# Altium schematic symbol library SCHLIB.SchLib: 2608 symbols (part 7 of 20) (continued)
## IC-SN65176BDR (continued)
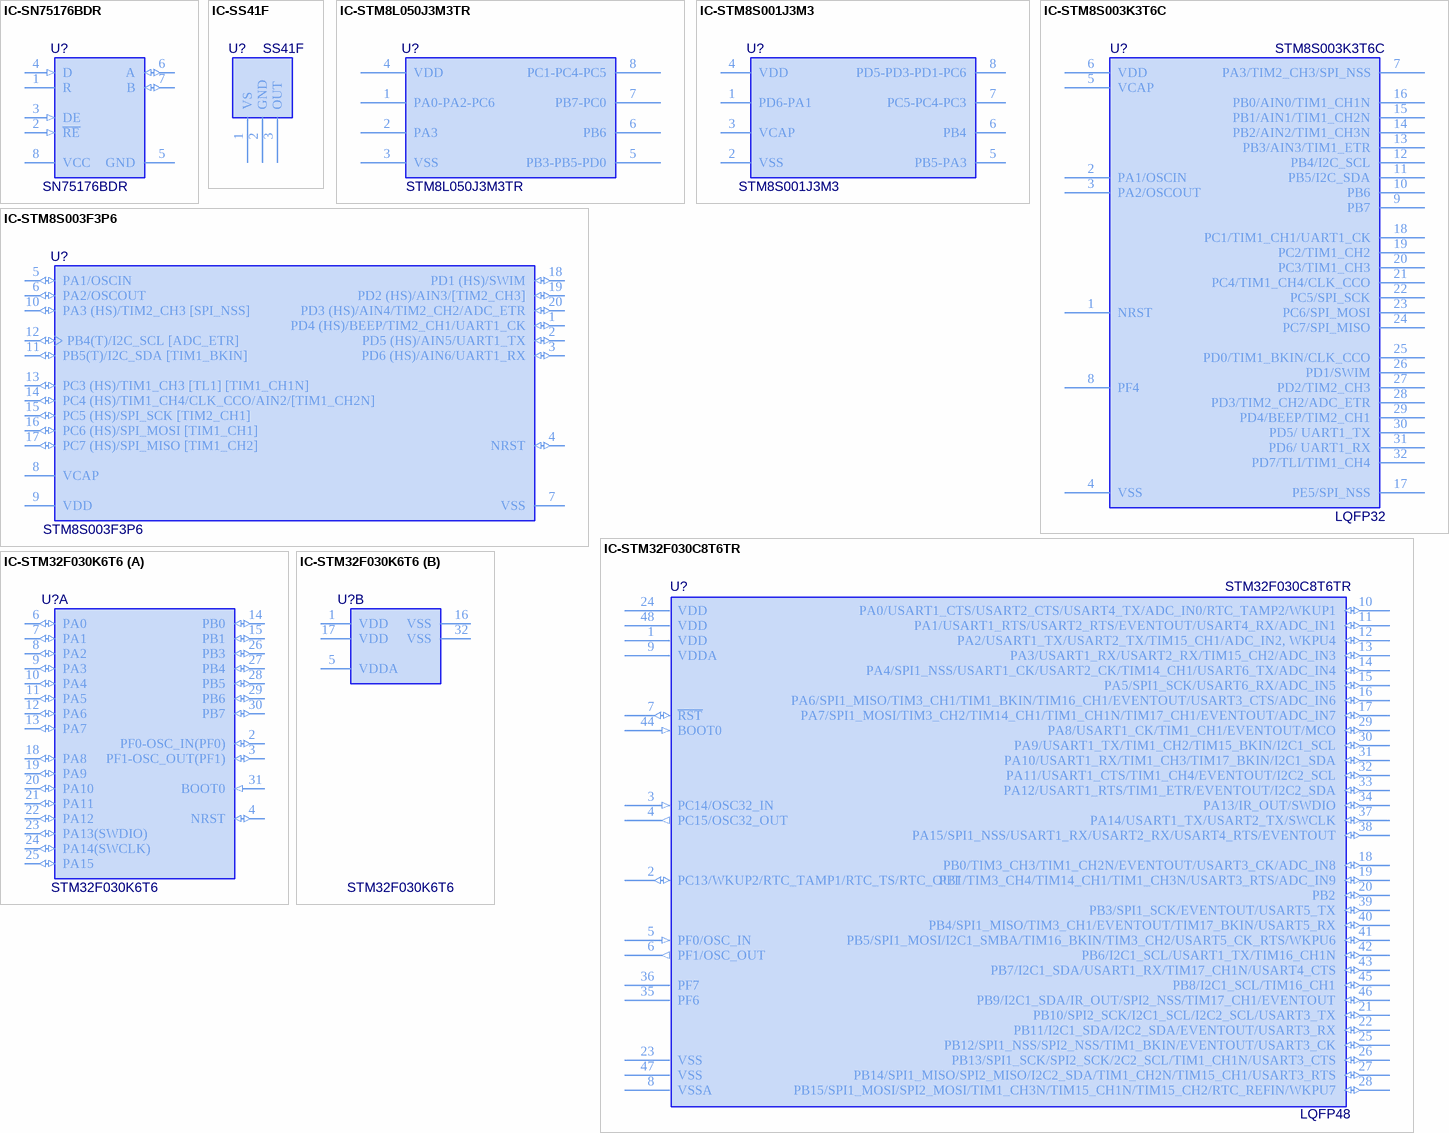
[diagram p27: symbols IC-SN75176BDR to IC-STM32F030K6T6]

## IC-SN75176BDR
designator U?, comment SN75176BDR
IC TXRX DIFF BUSS 8SOIC; Manufacturer: Texas Instruments; Data Rate: 10Mbps; Number of Receivers: 1; Operating Supply Voltage: 5V; Min Supply Voltage: 4.75V; Max Supply Voltage: 5.25V; Nominal Supply Current: 70mA; Logic Function: Transceiver; Simplex/Duplex: Half Duplex; Output Current: 60mA; Washability: OK; ComponentLink1URL: http://www.ti.com/general/docs/lit/getliterature.tsp?genericPartNumber=SN75176B&fileType=pdf; ComponentLink2URL: http://www.ti.com/lit/ml/msoi002j/msoi002j.pdf; ComponentLink2Description: Package Specification; ComponentLink1Description: Datasheet; Supplier 1: Digi-Key; Manufacturer Part Number: SN75176BDR; Stock 1: 10154; Pricing 1: 1=1.52000, 10=1.36800, 100=1.09940, 500=0.90324, 1000=0.74840 (USD); RoHS: Yes; Case/Package: D; Number of Pins: 8; Weight: 0.002561oz; Min Operating Temperature: 0°C; Max Operating Temperature: 70°C; Number of Transmitters: 1; Packaging: Tape and Reel; Package Quantity: 1; Number of Drivers: 1; Number of Transceivers: 1; Operating Supply Current: 70mA; Length: 4.9mm; Height: 1.58mm; Width: 3.91mm; Lead Free: Lead Free; REACH SVHC: No SVHC; ComponentLink3URL: https://datasheet.ciiva.com/4788/sn75176b-201537-4788388.pdf?src-supplier=Mouser; ComponentLink3Description: https://datasheet.ciiva.com/4788/sn75176b-201537-4788388.pdf?src-supplier=Mouser; ComponentLink4URL: https://datasheet.ciiva.com/34301/1054060-34301926.pdf?src-supplier=Jameco; ComponentLink4Description: https://datasheet.ciiva.com/34301/1054060-34301926.pdf?src-supplier=Jameco; ComponentLink5URL: https://datasheet.ciiva.com/1700/sn65176b-1700772.pdf?src-supplier=Digi-Key; ComponentLink5Description: https://datasheet.ciiva.com/1700/sn65176b-1700772.pdf?src-supplier=Digi-Key; ComponentLink6URL: https://datasheet.ciiva.com/1700/sn65176b-1700773.pdf?src-supplier=Digi-Key; ComponentLink6Description: https://datasheet.ciiva.com/1700/sn65176b-1700773.pdf?src-supplier=Digi-Key; ComponentLink7URL: https://datasheet.ciiva.com/1700/sn65176b-1700774.pdf?src-supplier=Digi-Key; ComponentLink7Description: https://datasheet.ciiva.com/1700/sn65176b-1700774.pdf?src-supplier=Digi-Key; ComponentLink8URL: https://datasheet.ciiva.com/46394/1886104-46394518.pdf?src-supplier=Element14; ComponentLink8Description: https://datasheet.ciiva.com/46394/1886104-46394518.pdf?src-supplier=Element14; ComponentLink9URL: https://datasheet.ciiva.com/8064/1886104-8064823.pdf?src-supplier=Element14; ComponentLink9Description: https://datasheet.ciiva.com/8064/1886104-8064823.pdf?src-supplier=Element14; ComponentLink10URL: https://datasheet.ciiva.com/46394/1886104-46394519.pdf?src-supplier=Element14; ComponentLink10Description: https://datasheet.ciiva.com/46394/1886104-46394519.pdf?src-supplier=Element14; ComponentLink11URL: https://datasheet.ciiva.com/46398/1886104-46398058.pdf?src-supplier=Element14; ComponentLink11Description: https://datasheet.ciiva.com/46398/1886104-46398058.pdf?src-supplier=Element14; ComponentLink12URL: https://datasheet.ciiva.com/48709/001048058-da-01-en-ic-dff-bus-txcvr-s-sn75176bdr-soic-8-tid-48709082.pdf?src-supplier=Conrad; ComponentLink12Description: https://datasheet.ciiva.com/48709/001048058-da-01-en-ic-dff-bus-txcvr-s-sn75176bdr-soic-8-tid-48709082.pdf?src-supplier=Conrad; Supplier Part Number 1: 296-1275-1-ND
footprint SOIC8-D0008A_M (SOIC, 8-Leads, Body 5x4mm, Pitch 1.27mm, IPC Low Density)
pins: 1 R (hiz), 2 ~{RE} (in), 3 DE (in), 4 D (in), 5 GND (power), 6 A (io), 7 B (io), 8 VCC (power)

## IC-SS41F
designator U?, comment SS41F
MAGNETIC SWITCH BIPOLAR RADIAL; Manufacturer: Honeywell; Nominal Supply Current: 10mA; Max Output Current: 20mA; Max Supply Voltage: 24V; Min Supply Voltage: 4.5V; Output Voltage: 400mV; Leakage Current: 10uA; Output Type: Digital; Max Surge Current: 1.5A; Forward Voltage: 600mV; Recovery Time: 10ns; Average Rectified Current: 350mA; Max Reverse Leakage Current: 5uA; Max Repetitive Reverse Voltage (Vrrm): 40V; Power Dissipation: 400mW; Element Configuration: Single; Polarity: Standard; Capacitance: 50pF; Washability: OK; Supplier 1: Digi-Key; Supplier Part Number 1: 480-5925-ND; Manufacturer Part Number: SS41F; Stock 1: 5477; Pricing 1: 1=1.96, 5=1.856, 10=1.59, 25=1.272, 50=1.166, 100=1.06, 500=0.9275, 1000=0.8215, 5000=0.7685 (USD); Case/Package: SIP; Number of Pins: 3; Min Operating Temperature: -40°C; Max Operating Temperature: 150°C; Packaging: Bulk; Package Quantity: 1000; Operating Supply Current: 10mA; Output Current: 20mA; Type: Integrated Circuit (IC); Mount: Surface Mount; Reverse Recovery Time: 10ns; Peak Non-Repetitive Surge Current: 1.5A; Peak Reverse Current: 5uA; Forward Current: 350mA; Max Forward Surge Current (Ifsm): 1.5A; Voltage Rating (DC): 40V; Current Rating: 350mA; Max Reverse Voltage (DC): 40V; Radiation Hardening: No; REACH SVHC: Unknown; Lead Free: Lead Free; ComponentLink1URL: https://www.verical.com/server-webapp/html/getDatasheet?partID=331926&src-supplier=Verical; ComponentLink1Description: https://www.verical.com/server-webapp/html/getDatasheet?partID=331926&src-supplier=Verical; ComponentLink2URL: http://www.mccsemi.com/up_pdf/SD103AWS-SD103CWS(SOD-323).PDF?src-supplier=Future+Electronics; ComponentLink2Description: http://www.mccsemi.com/up_pdf/SD103AWS-SD103CWS(SOD-323).PDF?src-supplier=Future+Electronics; ComponentLink3URL: http://www.mccsemi.com/up_pdf/SD103AWS-SD103CWS(SOD-323).PDF?src-supplier=Digi-Key; ComponentLink3Description: http://www.mccsemi.com/up_pdf/SD103AWS-SD103CWS(SOD-323).PDF?src-supplier=Digi-Key; ComponentLink4URL: http://www.farnell.com/datasheets/1684867.pdf?src-supplier=Element14; ComponentLink4Description: http://www.farnell.com/datasheets/1684867.pdf?src-supplier=Element14
footprint 3-sip
pins: 1 VS, 2 GND, 3 OUT

## IC-STM8L050J3M3TR
designator U?, comment STM8L050J3M3TR
8-BIT MICROCONTROLLERS - MCU; Manufacturer: STMicroelectronics; Washability: OK; Manufacturer Part Number: STM8L050J3M3TR; Stock: 2754; Pricing: 1=0.81, 10=0.713, 25=0.6696, 100=0.5465, 250=0.5076, 500=0.432, 1000=0.3456 (USD); RoHS: No; Supplier 1: Digi-Key; Supplier Part Number 1: 497-19455-1-ND; ComponentLink1Description: Datasheet; ComponentLink1URL: https://www.st.com/resource/en/datasheet/stm8l050j3.pdf
footprint SOIC8
pins: 1 PA0-PA2-PC6, 2 PA3, 3 VSS, 4 VDD, 5 PB3-PB5-PD0, 6 PB6, 7 PB7-PC0, 8 PC1-PC4-PC5

## IC-STM8S001J3M3
designator U?, comment STM8S001J3M3
8BIT MCU 8KBYTES FLASH 16MHZ CPU; Manufacturer: STMicroelectronics; Interface: I2C,SPI,IrDA,UART,USART; Peripherals: Brown-out Detect/Reset,POR,PWM,WDT; Number of I/Os: 5; Memory Size: 8KB; Oscillator Type: Internal; Washability: OK; Supplier 1: Digi-Key; Supplier Part Number 1: 497-17612-ND; Manufacturer Part Number: STM8S001J3M3; Stock 1: 5768; Pricing 1: 1=0.63, 10=0.554, 25=0.5208, 100=0.425, 250=0.3948, 500=0.336, 1000=0.2688, 2500=0.2436, 5000=0.2268 (USD); Case/Package: SOIC; Min Operating Temperature: -40°C; Max Operating Temperature: 125°C; Memory Type: FLASH; Packaging: Rail/Tube; Frequency: 16MHz; ComponentLink1URL: http://www.st.com/content/ccc/resource/technical/document/datasheet/group3/18/df/6e/12/9c/ca/41/75/DM00390996/files/DM00390996.pdf/jcr:content/translations/en.DM00390996.pdf?src-supplier=Digi-Key; ComponentLink1Description: http://www.st.com/content/ccc/resource/technical/document/datasheet/group3/18/df/6e/12/9c/ca/41/75/DM00390996/files/DM00390996.pdf/jcr:content/translations/en.DM00390996.pdf?src-supplier=Digi-Key; ComponentLink2URL: http://www.farnell.com/datasheets/2342758.pdf?src-supplier=Newark; ComponentLink2Description: http://www.farnell.com/datasheets/2342758.pdf?src-supplier=Newark; ComponentLink3URL: http://www.farnell.com/datasheets/2342758.pdf?src-supplier=Farnell; ComponentLink3Description: http://www.farnell.com/datasheets/2342758.pdf?src-supplier=Farnell
footprint SOIC8-D0008A_M (SOIC, 8-Leads, Body 5x4mm, Pitch 1.27mm, IPC Low Density)
pins: 1 PD6-PA1, 2 VSS, 3 VCAP, 4 VDD, 5 PB5-PA3, 6 PB4, 7 PC5-PC4-PC3, 8 PD5-PD3-PD1-PC6

## IC-STM8S003F3P6
designator U?, comment STM8S003F3P6
IC MCU 8BIT 8KB FLASH 20TSSOP; Manufacturer: STMicroelectronics; Connectivity: I²C,IrDA,LIN,SPI,UART/USART; Featured Product: FlasherSeriesofProductionTools; Program Memory Size: 8KB(8Kx8); Oscillator Type: Internal; Other Names: 497-11946-5; Core Processor: STM8; Package Version: Rev. 2, 01/2015; Peripherals: Brown-outDetect/Reset,POR,PWM,WDT; Data Converters: A/D5x10b; Other Related Documents: STM8S003F3ViewAllSpecifications; Number of I/Os: 16; EEPROM Size: 128x8; Speed: 16MHz; Core Size: 8-Bit; RAM Size: 1Kx8; Dynamic Catalog: STM8S; Voltage - Supply (Vcc/Vdd): 2.95V~5.5V; Watchdog Timer: Yes; Min Supply Voltage: 2.95V; Max Supply Voltage: 5.5V; Interface: I2C,SPI,IrDA,UART,USART,LIN; Number of Timers/Counters: 7; Max Power Dissipation: 238mW; Data Bus Width: 8b; Number of ADC Channels: 5; Number of SPI Channels: 1; Washability: OK; Series: STM8S; Category: IntegratedCircuits(ICs); Program Memory Type: FLASH; Packaging: Tube; Datasheet Version: Rev. 8, 04/2016; Manufacturer URL: http://www.st.com/; Package URL: http://www.st.com/st-web-ui/static/active/en/resource/technical/document/datasheet/DM00141386.pdf; Operating Temperature: -40°C~85°C; Package / Case: 20-TSSOP(0.173",4.40mmWidth); Standard Package: 74; Family: Embedded-Microcontrollers; Datasheet URL: http://www2.st.com/content/ccc/resource/technical/document/datasheet/42/5a/27/87/ac/5a/44/88/DM00024550.pdf/files/DM00024550.pdf/jcr:content/translations/en.DM00024550.pdf; Package Description: 20-Pin Thin Shrink Small Outline Package, Body 6.5 x 4.4 mm, Pitch 0.65 mm; Package Reference: TSSOP20; Mounting Technology: SurfaceMount; Number of I /O: 16; Supplier 1: Digi-Key; Supplier Part Number 1: 497-11946-5-ND; Manufacturer Part Number: STM8S003F3P6; Stock: 28510; Pricing: 1=0.77, 10=0.673, 25=0.6324, 100=0.5161, 250=0.4794, 500=0.408, 1000=0.3264, 2500=0.2958, 5000=0.2754 (USD); RoHS: Yes; Mount: Surface Mount; Case/Package: TSSOP; Number of Pins: 20; Min Operating Temperature: -40°C; Max Operating Temperature: 85°C; Frequency: 16MHz; Package Quantity: 74; Max Frequency: 16MHz; Number of I2C Channels: 1; Memory Type: FLASH; Memory Size: 8KB; Number of Programmable I/O: 16; Number of UART Channels: 1; Length: 6.6mm; Height: 1.05mm; Width: 4.5mm; Radiation Hardening: No; REACH SVHC: No SVHC; Lead Free: Lead Free; ComponentLink1URL: https://datasheet.ciiva.com/16216/dm00024550-16216214.pdf?src-supplier=Future+Electronics; ComponentLink1Description: https://datasheet.ciiva.com/16216/dm00024550-16216214.pdf?src-supplier=Future+Electronics; ComponentLink2URL: https://datasheet.ciiva.com/13036/dm00024550-13036971.pdf?src-supplier=Mouser; ComponentLink2Description: https://datasheet.ciiva.com/13036/dm00024550-13036971.pdf?src-supplier=Mouser; ComponentLink3URL: https://datasheet.ciiva.com/17232/dm00024550-17232894.pdf?src-supplier=Avnet+Europe; ComponentLink3Description: https://datasheet.ciiva.com/17232/dm00024550-17232894.pdf?src-supplier=Avnet+Europe
footprint STM-TSSOP20_V (SOP, 20-Leads, Body 6.6x4.5mm, Pitch 0.65mm)
pins: 1 PD4 (HS)/BEEP/TIM2_CH1/UART1_CK (io), 2 PD5 (HS)/AIN5/UART1_TX (io), 3 PD6 (HS)/AIN6/UART1_RX (io), 4 NRST (io) "Reset", 5 PA1/OSCIN (io), 6 PA2/OSCOUT (io), 7 VSS (power) "Digital ground", 8 VCAP (power) "1.8 V regulator  capacitor", 9 VDD (power) "Digital power supply", 10 PA3 (HS)/TIM2_CH3 [SPI_NSS] (io), 11 PB5(T)/I2C_SDA [TIM1_BKIN] (io), 12 PB4(T)/I2C_SCL [ADC_ETR] (io), 13 PC3 (HS)/TIM1_CH3 [TL1] [TIM1_CH1N] (io), 14 PC4 (HS)/TIM1_CH4/CLK_CCO/AIN2/[TIM1_CH2N] (io), 15 PC5 (HS)/SPI_SCK [TIM2_CH1] (io), 16 PC6 (HS)/SPI_MOSI [TIM1_CH1] (io), 17 PC7 (HS)/SPI_MISO [TIM1_CH2] (io), 18 PD1 (HS)/SWIM (io), 19 PD2 (HS)/AIN3/[TIM2_CH3] (io), 20 PD3 (HS)/AIN4/TIM2_CH2/ADC_ETR (io)

## IC-STM8S003K3T6C
designator U?, comment STM8S003K3T6C  Case/Package: LQFP32
IC MCU 8BIT 8KB FLASH 32LQFP; Manufacturer: STMicroelectronics; Interface: I2C,SPI,IrDA,UART,USART,LIN; RAM Size: 1KB; Max Power Dissipation: 330mW; Number of Timers/Counters: 7; Watchdog Timer: Yes; Data Bus Width: 8b; Number of Programmable I/O: 28; Max Frequency: 16MHz; Max Supply Voltage: 5.5V; Min Supply Voltage: 2.95V; Peripherals: Brown-out Detect/Reset,POR,PWM,WDT,I2C; Oscillator Type: Internal; Number of UART Channels: 1; Number of ADC Channels: 5; Data Rate: 8Mbps; Washability: OK; Supplier 1: Mouser; Manufacturer Part Number: STM8S003K3T6C; Stock 1: 1191; Pricing 1: 1=1,21000, 10=1,03000, 100=0,79700, 500=0,70400, 1000=0,55600, 2500=0,49300, 10000=0,47500, 25000=0,46000, 50000=0,44500 (USD); RoHS: Yes; Mount: Surface Mount; Number of Pins: 32; Min Operating Temperature: -40°C; Max Operating Temperature: 85°C; Memory Type: FLASH; Memory Size: 8KB; Packaging: Tray; Frequency: 16MHz; Number of I/Os: 28; Package Quantity: 250; Number of SPI Channels: 1; Number of I2C Channels: 1; Length: 7.2mm; Height: 1.45mm; Width: 7.2mm; Radiation Hardening: No; Lead Free: Lead Free; REACH SVHC: No SVHC; ComponentLink1URL: https://datasheet.ciiva.com/17377/dm00024550-17377834.pdf?src-supplier=Avnet+Europe; ComponentLink1Description: https://datasheet.ciiva.com/17377/dm00024550-17377834.pdf?src-supplier=Avnet+Europe; ComponentLink2URL: https://datasheet.ciiva.com/16380/dm00024550-16380393.pdf?src-supplier=Future+Electronics; ComponentLink2Description: https://datasheet.ciiva.com/16380/dm00024550-16380393.pdf?src-supplier=Future+Electronics; ComponentLink3URL: https://datasheet.ciiva.com/13041/dm00024550-13041260.pdf?src-supplier=Mouser; ComponentLink3Description: https://datasheet.ciiva.com/13041/dm00024550-13041260.pdf?src-supplier=Mouser; Supplier Part Number 1: 511-STM8S003K3T6C
footprint LQFP32
pins: 1 NRST, 2 PA1/OSCIN, 3 PA2/OSCOUT, 4 VSS, 5 VCAP, 6 VDD, 7 PA3/TIM2_CH3/SPI_NSS, 8 PF4, 9 PB7, 10 PB6, 11 PB5/I2C_SDA, 12 PB4/I2C_SCL, 13 PB3/AIN3/TIM1_ETR, 14 PB2/AIN2/TIM1_CH3N, 15 PB1/AIN1/TIM1_CH2N, 16 PB0/AIN0/TIM1_CH1N, 17 PE5/SPI_NSS, 18 PC1/TIM1_CH1/UART1_CK, 19 PC2/TIM1_CH2, 20 PC3/TIM1_CH3, 21 PC4/TIM1_CH4/CLK_CCO, 22 PC5/SPI_SCK, 23 PC6/SPI_MOSI, 24 PC7/SPI_MISO, 25 PD0/TIM1_BKIN/CLK_CCO, 26 PD1/SWIM, 27 PD2/TIM2_CH3, 28 PD3/TIM2_CH2/ADC_ETR, 29 PD4/BEEP/TIM2_CH1, 30  PD5/ UART1_TX, 31 PD6/ UART1_RX, 32 PD7/TLI/TIM1_CH4

## IC-STM32F030C8T6TR
designator U?, comment STM32F030C8T6TR  Package: LQFP48
IC MCU 32BIT 64KB FLASH 48LQFP; Manufacturer: STMicroelectronics; RAM Size: 8KB; Max Power Dissipation: 364mW; Interface: I2C,SPI,UART,USART; Number of I/Os: 39; Number of Timers/Counters: 7; Min Supply Voltage: 2.4V; Max Supply Voltage: 3.6V; Frequency: 48MHz; Oscillator Type: Internal; Data Bus Width: 32b; Number of ADC Channels: 12; Number of SPI Channels: 2; Number of PWM Channels: 6; Watchdog Timer: Yes; Peripherals: DMA,POR,PWM,WDT; Core Architecture: ARM; Washability: OK; Supplier 1: Digi-Key; Manufacturer Part Number: STM32F030C8T6TR; Stock 1: 0; Mount: Surface Mount; Number of Pins: 48; Weight: 0.006409oz; Min Operating Temperature: -40°C; Max Operating Temperature: 85°C; Packaging: Tape and Reel; Number of Programmable I/O: 39; Max Frequency: 48MHz; Number of I2C Channels: 2; Memory Type: FLASH; Memory Size: 64KB; Package Quantity: 2400; Length: 7.2mm; Height: 1.45mm; Width: 7.2mm; Radiation Hardening: No; REACH SVHC: No SVHC; Lead Free: Lead Free; Supplier Part Number 1: STM32F030C8T6TR-ND
footprint LQFP_48
footprint STM-LQFP48_M (QFP, 48-Leads, Body 7x7mm, Pitch 0.5mm, IPC Low Density)
pins: 1 VDD (power), 2 PC13/WKUP2/RTC_TAMP1/RTC_TS/RTC_OUT (io), 3 PC14/OSC32_IN (in), 4 PC15/OSC32_OUT (out), 5 PF0/OSC_IN (in), 6 PF1/OSC_OUT (out), 7 ~{RST} (io), 8 VSSA (power), 9 VDDA (power), 10 PA0/USART1_CTS/USART2_CTS/USART4_TX/ADC_IN0/RTC_TAMP2/WKUP1 (io), 11 PA1/USART1_RTS/USART2_RTS/EVENTOUT/USART4_RX/ADC_IN1 (io), 12 PA2/USART1_TX/USART2_TX/TIM15_CH1/ADC_IN2, WKPU4 (io), 13 PA3/USART1_RX/USART2_RX/TIM15_CH2/ADC_IN3 (io), 14 PA4/SPI1_NSS/USART1_CK/USART2_CK/TIM14_CH1/USART6_TX/ADC_IN4 (io), 15 PA5/SPI1_SCK/USART6_RX/ADC_IN5 (io), 16 PA6/SPI1_MISO/TIM3_CH1/TIM1_BKIN/TIM16_CH1/EVENTOUT/USART3_CTS/ADC_IN6 (io), 17 PA7/SPI1_MOSI/TIM3_CH2/TIM14_CH1/TIM1_CH1N/TIM17_CH1/EVENTOUT/ADC_IN7 (io), 18 PB0/TIM3_CH3/TIM1_CH2N/EVENTOUT/USART3_CK/ADC_IN8 (io), 19 PB1/TIM3_CH4/TIM14_CH1/TIM1_CH3N/USART3_RTS/ADC_IN9 (io), 20 PB2 (io), 21 PB10/SPI2_SCK/I2C1_SCL/I2C2_SCL/USART3_TX (io), 22 PB11/I2C1_SDA/I2C2_SDA/EVENTOUT/USART3_RX (io), 23 VSS (power), 24 VDD (power), 25 PB12/SPI1_NSS/SPI2_NSS/TIM1_BKIN/EVENTOUT/USART3_CK (io), 26 PB13/SPI1_SCK/SPI2_SCK/2C2_SCL/TIM1_CH1N/USART3_CTS (io), 27 PB14/SPI1_MISO/SPI2_MISO/I2C2_SDA/TIM1_CH2N/TIM15_CH1/USART3_RTS (io), 28 PB15/SPI1_MOSI/SPI2_MOSI/TIM1_CH3N/TIM15_CH1N/TIM15_CH2/RTC_REFIN/WKPU7 (io), 29 PA8/USART1_CK/TIM1_CH1/EVENTOUT/MCO (io), 30 PA9/USART1_TX/TIM1_CH2/TIM15_BKIN/I2C1_SCL (io), 31 PA10/USART1_RX/TIM1_CH3/TIM17_BKIN/I2C1_SDA (io), 32 PA11/USART1_CTS/TIM1_CH4/EVENTOUT/I2C2_SCL (io), 33 PA12/USART1_RTS/TIM1_ETR/EVENTOUT/I2C2_SDA (io), 34 PA13/IR_OUT/SWDIO (io), 35 PF6 (power), 36 PF7 (power), 37 PA14/USART1_TX/USART2_TX/SWCLK (io), 38 PA15/SPI1_NSS/USART1_RX/USART2_RX/USART4_RTS/EVENTOUT (io), 39 PB3/SPI1_SCK/EVENTOUT/USART5_TX (io), 40 PB4/SPI1_MISO/TIM3_CH1/EVENTOUT/TIM17_BKIN/USART5_RX (io), 41 PB5/SPI1_MOSI/I2C1_SMBA/TIM16_BKIN/TIM3_CH2/USART5_CK_RTS/WKPU6 (io), 42 PB6/I2C1_SCL/USART1_TX/TIM16_CH1N (io), 43 PB7/I2C1_SDA/USART1_RX/TIM17_CH1N/USART4_CTS (io), 44 BOOT0 (in), 45 PB8/I2C1_SCL/TIM16_CH1 (io), 46 PB9/I2C1_SDA/IR_OUT/SPI2_NSS/TIM17_CH1/EVENTOUT (io), 47 VSS (power), 48 VDD (power)

## IC-STM32F030K6T6
designator U?, comment STM32F030K6T6
IC MCU 32BIT 32KB FLASH 32LQFP; Manufacturer 1: STMicroelectronics; Core: ARM Cortex-M0; I/Os (High Current): 26; FLASH Size (Prog) (kB): 32; Operating Frequency(F) (Processor speed) (MHz): 48; Supply Voltage(Vcc) min (V): 2.4; Packing: Tray; Internal RAM Size (kB): 4; RAM Size: 4KB; Number of Timers/Counters: 5; Data Bus Width: 32b; Max Frequency: 48MHz; Number of ADC Channels: 12; Number of SPI Channels: 1; Core Architecture: ARM; Operating Supply Voltage: 3.3V; Interface: I2C,SPI,UART,USART; Max Supply Voltage: 3.6V; Max Power Dissipation: 357mW; Min Supply Voltage: 2.4V; Oscillator Type: Internal; Watchdog Timer: Yes; Peripherals: POR,PWM,WDT,DMA; Washability: OK; PackageDescription: 32-Pin Low Profile Quad Flat Package, 7 x 7 mm Body, 0.8 mm Pitch; PackageVersion: Rev. 1, 07/2013; ComponentLink1Description: Manufacturer URL; ComponentLink2URL: http://www.st.com/st-web-ui/static/active/en/resource/technical/document/datasheet/DM00088500.pdf; PackageReference: LQFP32; PartNumber: STM32F030K6T6; Mounting Technology: Surface Mount; DatasheetVersion: Rev. 1; ComponentLink2Description: Datasheet; ComponentLink3URL: http://www.st.com/st-web-ui/static/active/en/resource/technical/document/datasheet/DM00088500.pdf; ComponentLink1URL: http://www.st.com/web/en/home.html; ComponentLink3Description: Package Specification; Supplier 1: Digi-Key; Manufacturer Part Number 1: STM32F030K6T6; Stock 1: 8058; Pricing 1: 1=1,49000, 10=1,33400, 100=1,03980, 500=0,85900, 1000=0,67815 (USD); RoHS: Yes; Case/Package: LQFP; Number of Pins: 32; Weight: 0.027302oz; Contact Plating: Tin; Min Operating Temperature: -40°C; Max Operating Temperature: 85°C; Number of I2C Channels: 1; Memory Type: FLASH; Memory Size: 32KB; Package Quantity: 250; Frequency: 48MHz; Number of I/Os: 26; Packaging: Tray; Number of Programmable I/O: 26; Length: 7.2mm; Height: 1.45mm; Width: 7.2mm; Radiation Hardening: No; Lead Free: Lead Free; REACH SVHC: No SVHC; ComponentLink4URL: https://datasheet.ciiva.com/29987/dm00088500-29987017.pdf?src-supplier=Avnet; ComponentLink4Description: https://datasheet.ciiva.com/29987/dm00088500-29987017.pdf?src-supplier=Avnet; ComponentLink5URL: https://datasheet.ciiva.com/46427/1792126-46427291.pdf?src-supplier=Element14; ComponentLink5Description: https://datasheet.ciiva.com/46427/1792126-46427291.pdf?src-supplier=Element14; Supplier Part Number 1: 497-14046-ND
footprint STM-LQFP32_L (QFP, 32-Leads, Body 7x7mm, Pitch 0.8mm, IPC High Density)
part A pins: 2 PF0-OSC_IN(PF0) (io) "PF0-OSC_IN(PF0)/OSC_IN", 3 PF1-OSC_OUT(PF1) (io) "PF1-OSC_OUT(PF1)/OSC_OUT", 4 NRST (io) "Device reset input / internal reset output (active low)", 6 PA0 (io) "PA0/USART1_CTS/ADC_IN0,RTC_TAMP2,WKUP1", 7 PA1 (io) "PA1/USART1_RTS,EVENTOUT/ADC_IN1", 8 PA2 (io) "PA2/USART1_TX/ADC_IN2", 9 PA3 (io) "PA3/USART1_RX/ADC_IN3", 10 PA4 (io) "PA4/SPI1_NSS,USART1_CK,TIM14_CH1/ADC_IN4", 11 PA5 (io) "PA5/SPI1_SCK/ADC_IN5", 12 PA6 (io) "PA6/SPI1_MISO,TIM3_CH1,TIM1_BKIN,TIM16_CH1,EVENTOUT/ADC_IN6", 13 PA7 (io) "PA7/SPI1_MOSI,TIM3_CH2,TIM14_CH1,TIM1_CH1N,TIM17_CH1,EVENTOUT/ADC_IN7", 14 PB0 (io) "PB0/TIM3_CH3,TIM1_CH2N,EVENTOUT/ADC_IN8", 15 PB1 (io) "PB1/TIM3_CH4,TIM14_CH1,TIM1_CH3N/ADC_IN9", 18 PA8 (io) "PA8/USART1_CK,TIM1_CH1,EVENTOUT,MCO", 19 PA9 (io) "PA9/USART1_TX,TIM1_CH2,I2C1_SCL", 20 PA10 (io) "PA10/USART1_RX,TIM1_CH3,TIM17_BKIN,I2C1_SDA", 21 PA11 (io) "PA11/USART1_CTS,TIM1_CH4,EVENTOUT", 22 PA12 (io) "PA12/USART1_RTS,TIM1_ETR,EVENTOUT", 23 PA13(SWDIO) (io) "PA13(SWDIO)/IR_OUT,SWDIO", 24 PA14(SWCLK) (io) "PA14(SWCLK)/USART1_TX,SWCLK", 25 PA15 (io) "PA15/SPI1_NSS,USART1_RX,EVENTOUT", 26 PB3 (io) "PB3/SPI1_SCK,EVENTOUT", 27 PB4 (io) "PB4/SPI1_MISO,TIM3_CH1,EVENTOUT", 28 PB5 (io) "PB5/SPI1_MOSI,I2C1_SMBA,TIM16_BKIN,TIM3_CH2", 29 PB6 (io) "PB6/I2C1_SCL,USART1_TX,TIM16_CH1N", 30 PB7 (io) "PB7/I2C1_SDA,USART1_RX,TIM17_CH1N", 31 BOOT0 (in) "Boot memory selection"
part B pins: 1 VDD (power) "Digital power supply", 5 VDDA (power) "Analog power supply", 16 VSS (power) "Ground", 17 VDD (power) "Digital power supply", 32 VSS (power) "Ground"
